# Altium footprint library ESKDPcbLib.PcbLib: 608 footprints (part 18 of 38)
Each footprint in its own frame and in the unit in brackets; x right, y up, seen from the top. Pads: shape width x height; smd on the part's side, far side on the other; paste and mask are expansions set on the pad; w line width, h text height; cw(c..) or ccw(c..) is an arc to the next point about the centre after c.
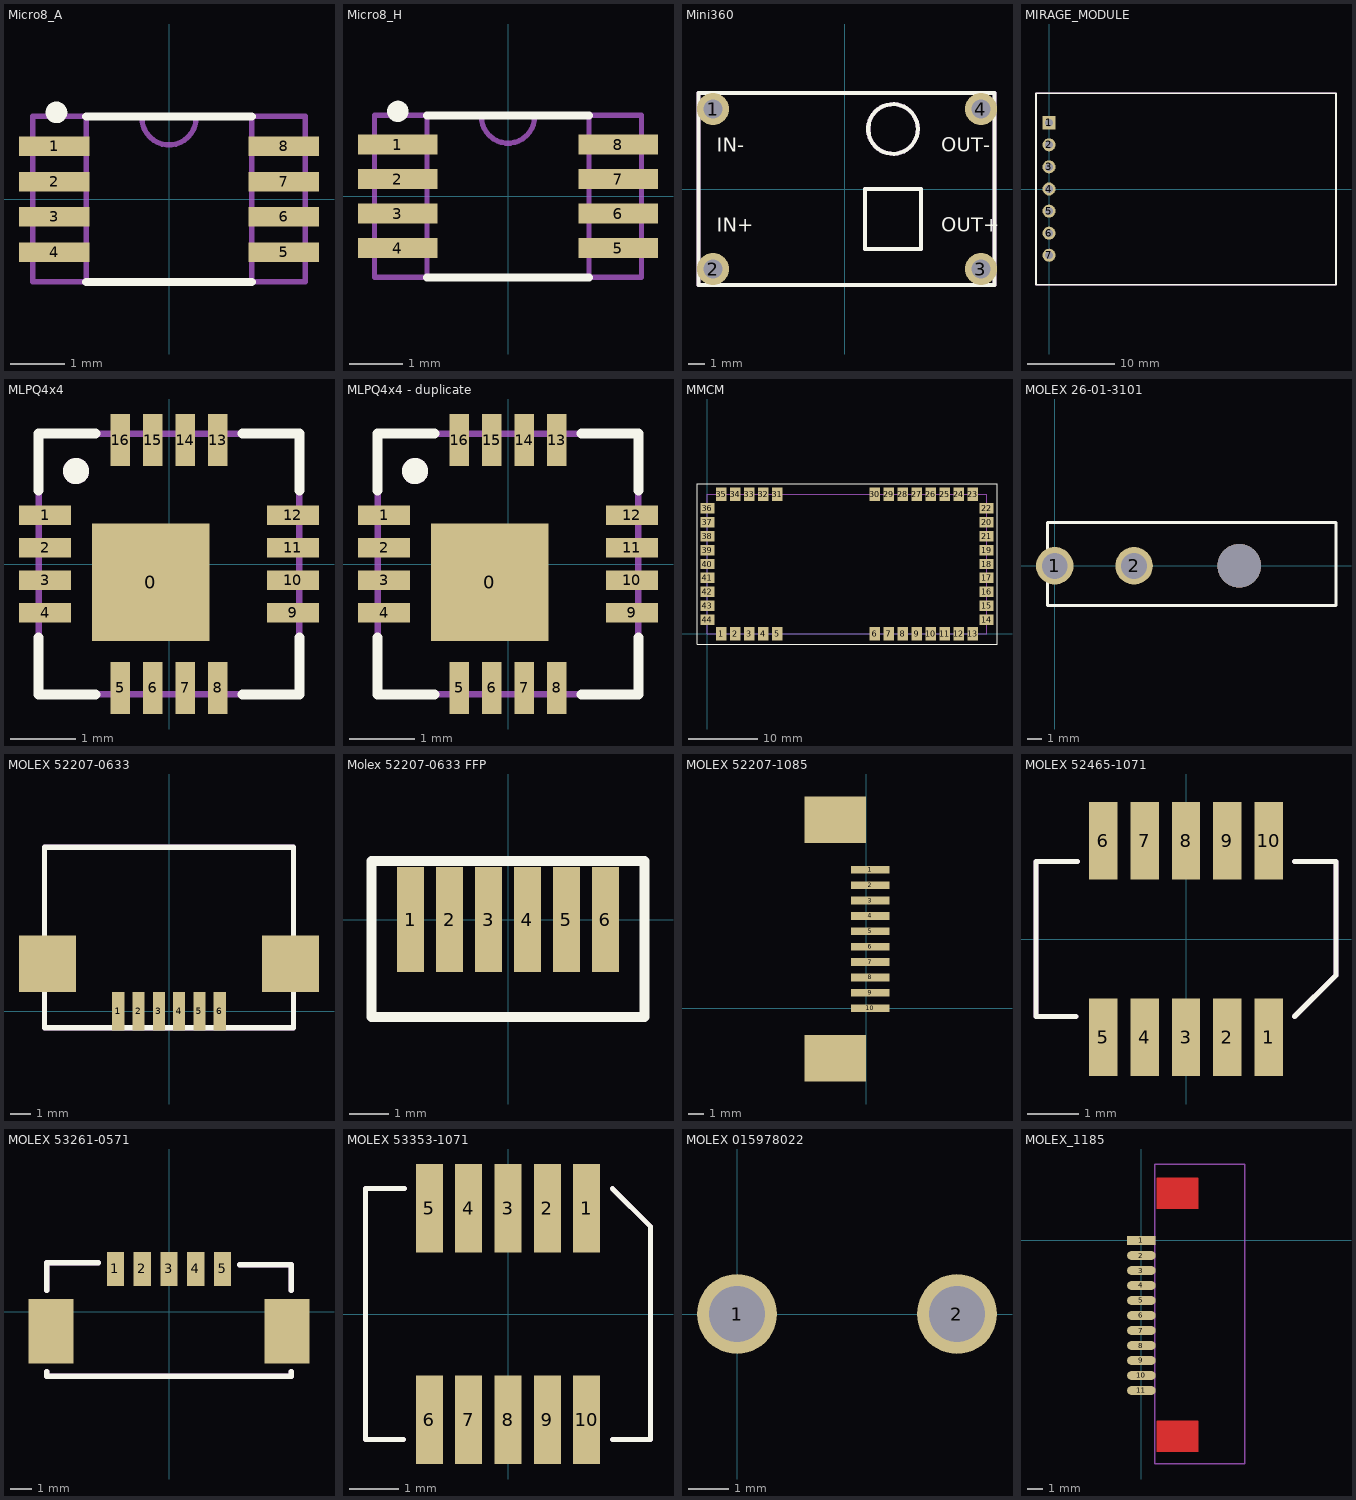
[diagram p17: the footprints below, top view; thin cyan lines are the x and y axes]

## Micro8_A [mm]
height 1.11
pads (8):
  rect 1.3x0.36 smd: 1(-2.115,0.975) 2(-2.115,0.325) 3(-2.115,-0.325) 4(-2.115,-0.975) 5(2.115,-0.975) 6(2.115,-0.325) 7(2.115,0.325) 8(2.115,0.975)
Top Overlay:
  circle w0.2: c-2.075,1.6 r0.1
  lines w0.15: -1.525,-1.525 1.525,-1.525 ; -1.525,1.525 1.525,1.525
Mechanical 7:
  lines w0.1: -1.525,-1.525 -1.525,1.525 ; -0.499,1.525 ccw(c0,1.5) 0.499,1.525 ; 1.525,-1.525 1.525,1.525 ; -2.515,-1.525 -2.515,1.525 2.515,1.525 2.515,-1.525 -2.515,-1.525
Mechanical 10:
  text ".Comment" at -0.67,-2.26 h0.6
  text ".Designator" at -0.67,2.04 h0.8
3D body: height 0.7, standoff 0, extent -2.515,-1.525 -1.525,1.525
3D body: height 0.7, standoff 0, extent 1.525,-1.525 2.515,1.525
3D body: height 1.11, standoff 0, extent -1.525,-1.525 1.525,1.525

## Micro8_H [mm]
height 1.11
pads (8):
  rect 1.5x0.38 smd: 1(-2.075,0.975) 2(-2.075,0.325) 3(-2.075,-0.325) 4(-2.075,-0.975) 5(2.075,-0.975) 6(2.075,-0.325) 7(2.075,0.325) 8(2.075,0.975)
Top Overlay:
  circle w0.2: c-2.075,1.6 r0.1
  lines w0.15: -1.525,-1.525 1.525,-1.525 ; -1.525,1.525 1.525,1.525
Mechanical 7:
  lines w0.1: -1.525,-1.525 -1.525,1.525 ; -0.499,1.525 ccw(c0,1.5) 0.499,1.525 ; 1.525,-1.525 1.525,1.525 ; -2.515,-1.525 2.515,-1.525 2.515,1.525 -2.515,1.525 -2.515,-1.525
Mechanical 10:
  text ".Designator" at -0.67,2.04 h0.8
  text ".Comment" at -0.67,-2.26 h0.6
3D body: height 1.11, standoff 0, extent -1.525,-1.525 1.525,1.525
3D body: height 0.7, standoff 0, extent 1.525,-1.525 2.515,1.525
3D body: height 0.7, standoff 0, extent -2.515,-1.525 -1.525,1.525

## Mini360 [mm]
pads (4):
  round 2 hole 1.2: 1(-8.25,5) 2(-8.25,-5) 3(8.5,-5) 4(8.5,5)
Top Overlay:
  circle w0.254: c3,3.75 r1.55
  lines w0.254: -9.15,-6 -9.15,6 9.35,6 9.35,-6 -9.15,-6 ; 1.25,-3.75 1.25,0 4.75,0 4.75,-3.75 1.25,-3.75
  text "OUT+" at 6,-3 h1.52
  text "OUT-" at 6,2 h1.52
  text "IN+" at -8,-3 h1.52
  text "IN-" at -8,2 h1.52
Mechanical 7:
  circle w0.254: c3,3.75 r1.55
  lines w0.254: -9.15,-6 9.35,-6 9.35,6 -9.15,6 -9.15,-6 ; 1.25,-3.75 1.25,0 4.75,0 4.75,-3.75 1.25,-3.75
Mechanical 10:
  text ".Designator" at 3,7.5 h1
  text ".Comment" at 3,6.5 h1

## MIRAGE_MODULE [mm]
pads (7):
  rect 1.5x1.5 hole 0.9: 1(0,7.62)
  round 1.5 hole 0.9: 2(0,5.08) 3(0,2.54) 4(0,0) 5(0,-2.54) 6(0,-5.08) 7(0,-7.62)
Top Overlay:
  lines w0.2: -1.5,-11 -1.5,11 33,11 33,-11 -1.5,-11
Mechanical 7:
  lines w0.2: -1.5,-11 33,-11 33,11 -1.5,11 -1.5,-11
3D body: height 5, standoff -3, extent -0.3,-7.94 0.3,-7.34
3D body: height 5, standoff -3, extent -0.3,-5.4 0.3,-4.8
3D body: height 5, standoff -3, extent -0.3,-2.86 0.3,-2.26
3D body: height 5, standoff -3, extent -0.3,-0.32 0.3,0.28
3D body: height 5, standoff -3, extent -0.3,2.22 0.3,2.82
3D body: height 5, standoff -3, extent -0.3,4.78 0.3,5.38
3D body: height 5, standoff -3, extent -0.3,7.3 0.3,7.9
3D body: height 4, standoff 3, extent -1.5,-11 2,11
3D body: height 3, standoff 0, extent -1.5,-11 2,11
3D body: height 7, standoff 3, extent 2,-11 33,11

## MLPQ4x4 [mm]
height 1
pads (17):
  rect 1.8x1.8 smd: 0(-0.28,-0.28)
  rect 0.8x0.3 smd: 1(-1.9,0.75) 2(-1.9,0.25) 3(-1.9,-0.25) 4(-1.9,-0.75) 9(1.9,-0.75) 10(1.9,-0.25) 11(1.9,0.25) 12(1.9,0.75)
  rect 0.3x0.8 smd: 5(-0.75,-1.9) 6(-0.25,-1.9) 7(0.25,-1.9) 8(0.75,-1.9) 13(0.75,1.9) 14(0.25,1.9) 15(-0.25,1.9) 16(-0.75,1.9)
Top Overlay:
  circle w0.2: c-1.425,1.425 r0.1
  lines w0.15: -2,-1.125 -2,-2 -1.125,-2 ; -2,1.125 -2,2 -1.125,2 ; 1.125,-2 2,-2 2,-1.125 ; 1.125,2 2,2 2,1.125
Mechanical 7:
  circle w0.2: c-1.425,1.425 r0.1
  lines w0.1: -2,-2 -2,2 2,2 2,-2 -2,-2
Mechanical 10:
  text ".Comment" at -0.65,2.775 h0.6
  text ".Designator" at -1.05,3.425 h0.8
3D body: height 1, standoff 0, extent -2,-2 2,2

## MLPQ4x4 - duplicate [mm]
height 1
pads (17):
  rect 1.8x1.8 smd: 0(-0.28,-0.28)
  rect 0.8x0.3 smd: 1(-1.9,0.75) 2(-1.9,0.25) 3(-1.9,-0.25) 4(-1.9,-0.75) 9(1.9,-0.75) 10(1.9,-0.25) 11(1.9,0.25) 12(1.9,0.75)
  rect 0.3x0.8 smd: 5(-0.75,-1.9) 6(-0.25,-1.9) 7(0.25,-1.9) 8(0.75,-1.9) 13(0.75,1.9) 14(0.25,1.9) 15(-0.25,1.9) 16(-0.75,1.9)
Top Overlay:
  circle w0.2: c-1.425,1.425 r0.1
  lines w0.15: -2,-1.125 -2,-2 -1.125,-2 ; -2,1.125 -2,2 -1.125,2 ; 1.125,-2 2,-2 2,-1.125 ; 1.125,2 2,2 2,1.125
Mechanical 7:
  circle w0.2: c-1.425,1.425 r0.1
  lines w0.1: -2,-2 -2,2 2,2 2,-2 -2,-2
Mechanical 10:
  text ".Comment" at -0.65,2.775 h0.6
  text ".Designator" at -1.05,3.425 h0.8
3D body: height 1, standoff 0, extent -2,-2 2,2

## MMCM [mm]
height 4
pads (44):
  rect 1.5x2 smd mask+0.075: 1(2,0) 2(4,0) 3(6,0) 4(8,0) 5(10,0) 6(24,0) 7(26,0) 8(28,0) 9(30,0) 10(32,0) 11(34,0) 12(36,0) 13(38,0) 23(38,20) 24(36,20) 25(34,20) 26(32,20) 27(30,20) 28(28,20) 29(26,20) 30(24,20) 31(10,20) 32(8,20) 33(6,20) 34(4,20) 35(2,20)
  rect 2x1.5 smd mask+0.075: 14(40,2) 15(40,4) 16(40,6) 17(40,8) 18(40,10) 19(40,12) 20(40,16) 21(40,14) 22(40,18) 36(0,18) 37(0,16) 38(0,14) 39(0,12) 40(0,10) 41(0,8) 42(0,6) 43(0,4) 44(0,2)
Top Overlay:
  lines w0.1: -1.5,-1.5 41.5,-1.5 41.5,21.5 -1.5,21.5 -1.5,-1.5
Mechanical 7:
  lines w0.1: 0,0 0,20 40,20 40,0 0,0
Mechanical 10:
  text ".Comment" at 18.373,13 h1
  text ".Designator" at 18.373,10 h1
3D body: height 4.6, standoff 0.32, extent 0,0 40,20

## MOLEX 26-01-3101 [mm]
pads (2):
  round 2.6 hole 1.8: 1(0,0) 2(5.5,0)
via 12.8,0 diameter 3 hole 3
Top Overlay:
  lines w0.2: -0.5,-2.75 19.5,-2.75 19.5,3 19.25,3 -0.5,3 -0.5,-2.75
3D body: height 11.4, standoff -3.6, extent -0.542,-2.7 19.393,3.1

## MOLEX 52207-0633 [mm] "Разъем на плату"
pads (8):
  rect 0.6x1.9 smd: 1(-2.5,0) 2(-1.5,0) 3(-0.5,0) 4(0.5,0) 5(1.5,0) 6(2.5,0)
  rect 2.8x2.8 smd: ""(-6,2.35) ""(6,2.35)
Top Overlay:
  lines w0.254: -6.15,-0.8 6.15,-0.8 6.15,8.1 -6.15,8.1 -6.15,-0.8
Mechanical 7:
  lines w0.254: -6.15,-0.8 6.15,-0.8 6.15,8.1 -6.15,8.1 -6.15,-0.8
Mechanical 10:
  text ".Comment" at -3.144,9.629 h1.52
  text ".Designator" at -3.025,8.55 h1.52
3D body: height 2.7, standoff 0, extent -6.15,-0.8 6.15,8.1

## Molex 52207-0633 FFP [mm] "Шлейф"
pads (6):
  rect 0.7x2.7 smd: 1(-2.5,0) 2(-1.5,0) 3(-0.5,0) 4(0.5,0) 5(1.5,0) 6(2.5,0)
Top Overlay:
  lines w0.254: -3.5,-2.5 -3.5,1.5 3.5,1.5 3.5,-2.5 -3.5,-2.5

## MOLEX 52207-1085 [mm]
pads (12):
  rect 2.5x0.5 smd: 1(0.25,9) 2(0.25,8) 3(0.25,7) 4(0.25,6) 5(0.25,5) 6(0.25,4) 7(0.25,3) 8(0.25,2) 9(0.25,1) 10(0.25,0)
  rect 4x3 smd: ""(-2,-3.25) ""(-2,12.25)
3D body: height 2.67, standoff -0.03, extent -8.1,-3.65 0.8,12.65

## MOLEX 52465-1071 [mm]
pads (10):
  rect 0.55x1.5 smd: 1(1.6,-1.9) 2(0.8,-1.9) 3(0,-1.9) 4(-0.8,-1.9) 5(-1.6,-1.9) 6(-1.6,1.9) 7(-0.8,1.9) 8(0,1.9) 9(0.8,1.9) 10(1.6,1.9)
Top Overlay:
  lines w0.1: -2.125,-1.5 -2.9,-1.5 -2.9,1.5 -2.1,1.5 ; 2.1,-1.5 2.9,-0.7 2.9,0.6 2.9,0.8 2.9,1.5 2.1,1.5
Mechanical 7:
  lines w0.1: -2.125,-1.5 -2.9,-1.5 -2.9,1.5 -2.1,1.5 ; 2.1,-1.5 2.9,-0.7 2.9,0.8 2.9,1.5 2.1,1.5
Mechanical 10:
  text ".Designator" at 0,4 h1.52
  text ".Comment" at 0,6 h1.52
3D body: height 3.53, standoff -0.02, extent -2.8,-2.1 2.8,2.1

## MOLEX 53261-0571 [mm]
pads (7):
  rect 0.8x1.6 smd: 1(-2.5,2) 2(-1.25,2) 3(0,2) 4(1.25,2) 5(2.5,2)
  rect 2.1x3 smd: ""(-5.5,-0.9) ""(5.5,-0.9)
Top Overlay:
  lines w0.254: -5.7,-2.8 -5.7,-3 5.7,-3 5.7,-2.8 ; -5.7,1 -5.7,2.3 -3.3,2.3 ; 3.3,2.2 5.7,2.2 5.7,1
Mechanical 7:
  lines w0.254: -5.7,-2.8 -5.7,-3 5.7,-3 5.7,-2.8 ; -5.7,1 -5.7,2.3 -3.3,2.3 ; 3.3,2.2 5.7,2.2 5.7,1
Mechanical 10:
  text ".Designator" at -5.3,5.1 h1
  text ".Comment" at -5.3,4.1 h1
3D body "532610571.stp": height 3.4, standoff 0, extent -5.7,-2.975 5.7,2.225

## MOLEX 53353-1071 [mm]
pads (10):
  rect 0.55x1.8 smd: 1(1.6,2.15) 2(0.8,2.15) 3(0,2.15) 4(-0.8,2.15) 5(-1.6,2.15) 6(-1.6,-2.15) 7(-0.8,-2.15) 8(0,-2.15) 9(0.8,-2.15) 10(1.6,-2.15)
Top Overlay:
  lines w0.1: -2.125,-2.55 -2.9,-2.55 -2.9,2.55 -2.1,2.55 ; 2.125,-2.55 2.9,-2.55 2.9,1.775 2.125,2.55
Mechanical 7:
  lines w0.1: -2.125,-2.55 -2.9,-2.55 -2.9,2.55 -2.1,2.55 ; 2.125,-2.55 2.9,-2.55 2.9,1.775 2.125,2.55
Mechanical 10:
  text ".Comment" at 0,6 h1.52
  text ".Designator" at 0,4 h1.52
3D body: height 6.15, standoff 0, extent -2.9,-2.55 2.9,2.55

## MOLEX 015978022 [mm]
pads (2):
  round 2 hole 1.4: 1(0,0) 2(5.5,0)
3D body: height 13.1, standoff -4.1, extent -0.5,-7.8 19.4,7.6

## MOLEX_1185 [mm]
pads (11):
  rect 1.9x0.6 smd: 1(0,0)
  oval 1.9x0.6 smd: 2(0,-1) 3(0,-2) 4(0,-3) 5(0,-4) 6(0,-5) 7(0,-6) 8(0,-7) 9(0,-8) 10(0,-9) 11(0,-10)
Top Layer:
  rectangle: 1,2.1 3.8,4.2
  rectangle: 1,-14.108 3.8,-12.008
Top Solder:
  rectangle: 0.9,2 3.9,4.3
  rectangle: 0.9,-14.208 3.9,-11.908
Mechanical 1:
  lines w0.1: 0.9,-14.9 0.9,5.1 6.9,5.1 6.9,-14.9 0.9,-14.9